# Altium footprint library ICs And Semiconductors SMD.PcbLib: 943 footprints (part 57 of 60)
Each footprint in its own frame and in the unit in brackets; x right, y up, seen from the top. Pads: shape width x height; smd on the part's side, far side on the other; paste and mask are expansions set on the pad; w line width, h text height; cw(c..) or ccw(c..) is an arc to the next point about the centre after c.
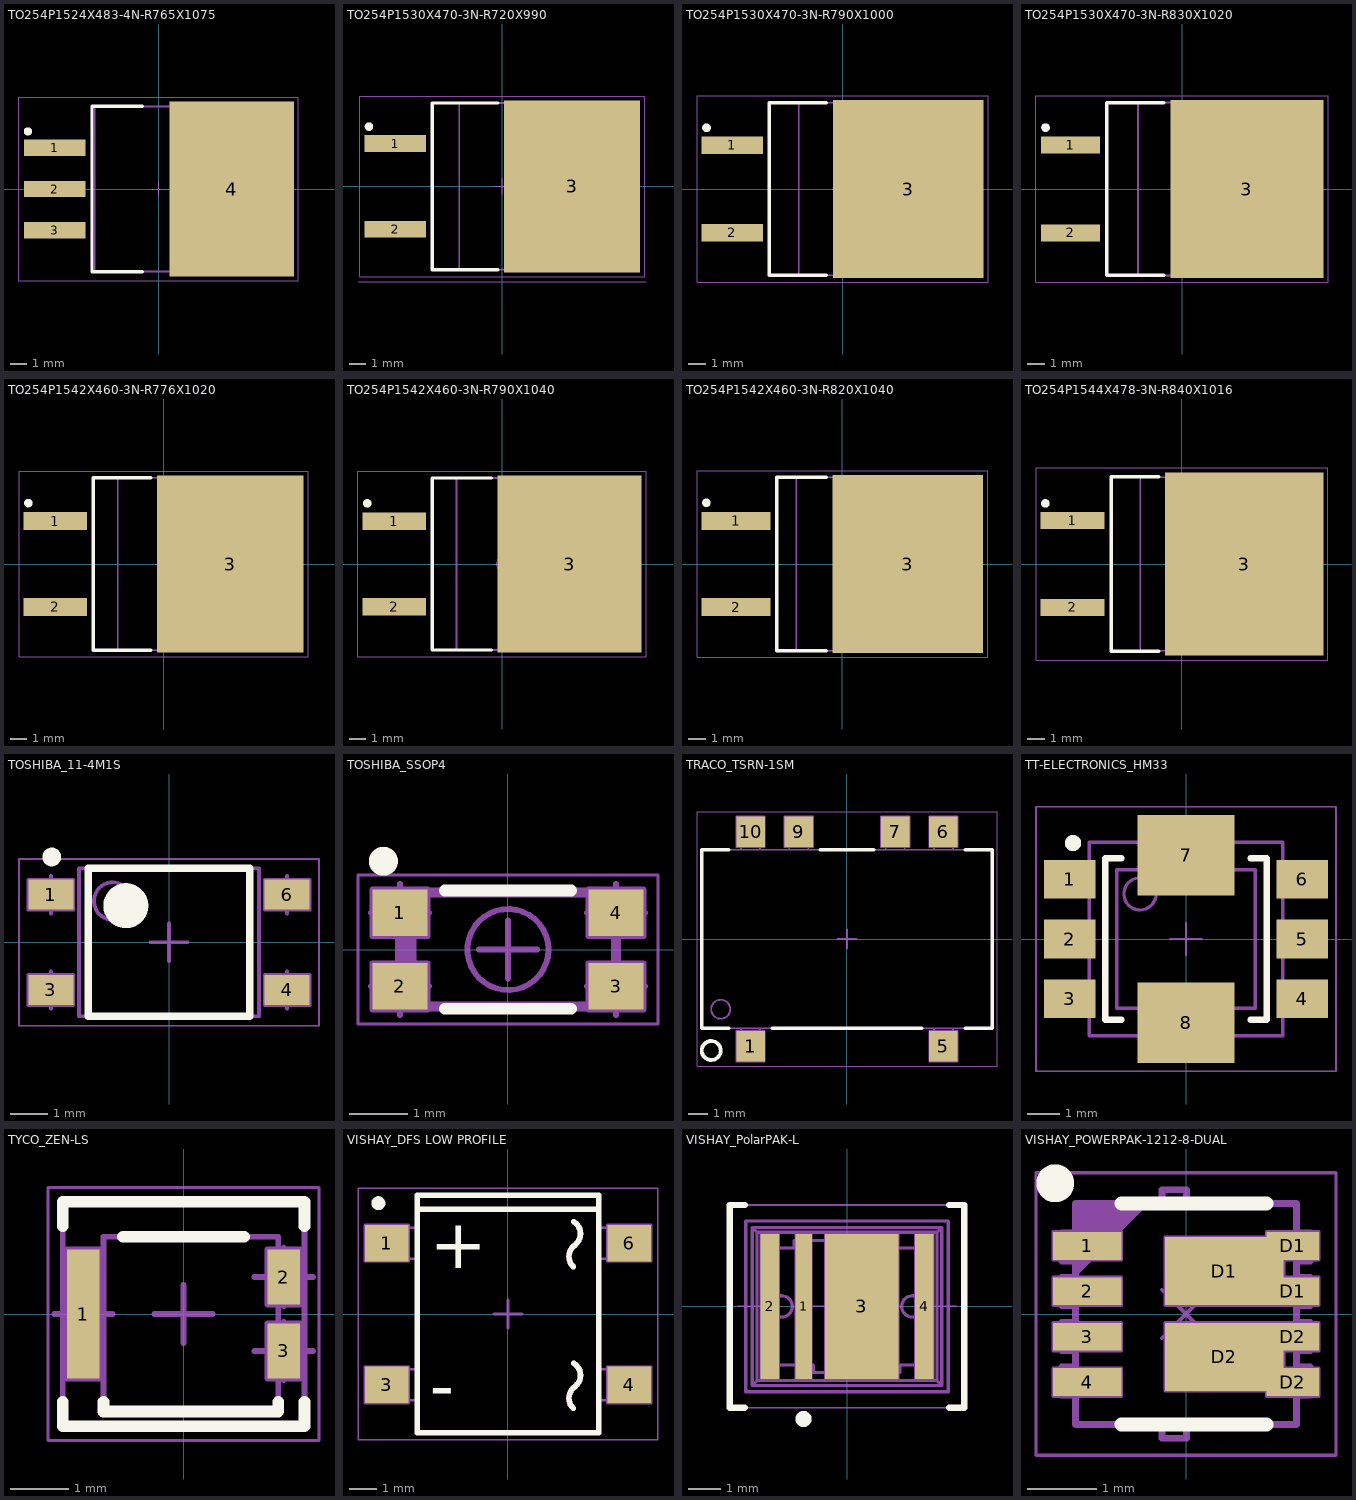
[diagram p56: the footprints below, top view; thin cyan lines are the x and y axes]

## TO254P1524X483-4N-R765X1075 [mm] "D2PAK TO-263, TO, 2.54mm pitch; 3 pin, 15.24mm L X 10.67mm W X 4.83mm H body, IPC Medium Density"
height 4.83
pads (4):
  rect 3.8x1 smd: 1(-6.4,2.54) 2(-6.4,0) 3(-6.4,-2.54)
  rect 7.65x10.75 smd: 4(4.5,0)
Top Overlay:
  circle w0.25: c-8.05,3.55 r0.125
  lines w0.2: -1,-5.1 -4.1,-5.1 -4.1,5.1 -1,5.1
Top Paste:
  region: 0.59,-4.8 1.93,-4.8 1.93,-3.36 0.59,-3.36
  region: 2.65,-4.8 3.99,-4.8 3.99,-3.36 2.65,-3.36
  region: 4.71,-4.8 6.05,-4.8 6.05,-3.36 4.71,-3.36
  region: 6.77,-4.8 8.11,-4.8 8.11,-3.36 6.77,-3.36
  region: 0.59,-2.76 1.93,-2.76 1.93,-1.32 0.59,-1.32
  region: 2.65,-2.76 3.99,-2.76 3.99,-1.32 2.65,-1.32
  region: 4.71,-2.76 6.05,-2.76 6.05,-1.32 4.71,-1.32
  region: 6.77,-2.76 8.11,-2.76 8.11,-1.32 6.77,-1.32
  region: 0.59,-0.72 1.93,-0.72 1.93,0.72 0.59,0.72
  region: 2.65,-0.72 3.99,-0.72 3.99,0.72 2.65,0.72
  region: 4.71,-0.72 6.05,-0.72 6.05,0.72 4.71,0.72
  region: 6.77,-0.72 8.11,-0.72 8.11,0.72 6.77,0.72
  region: 0.59,1.32 1.93,1.32 1.93,2.76 0.59,2.76
  region: 2.65,1.32 3.99,1.32 3.99,2.76 2.65,2.76
  region: 4.71,1.32 6.05,1.32 6.05,2.76 4.71,2.76
  region: 6.77,1.32 8.11,1.32 8.11,2.76 6.77,2.76
  region: 0.59,3.36 1.93,3.36 1.93,4.8 0.59,4.8
  region: 2.65,3.36 3.99,3.36 3.99,4.8 2.65,4.8
  region: 4.71,3.36 6.05,3.36 6.05,4.8 4.71,4.8
  region: 6.77,3.36 8.11,3.36 8.11,4.8 6.77,4.8
Mechanical 14:
  lines w0.1: 6.48,-5.08 6.856,-5.08 7.62,-4.234 7.62,4.234 6.856,5.08 6.48,5.08 ; 6.48,-5.08 6.48,5.08 ; 6.48,-5.08 -3.945,-5.08 -3.945,5.08 6.48,5.08
Mechanical 15:
  lines w0.05: -0.5,0 0.5,0 ; 0,-0.5 0,0.5 ; -8.6,-5.65 -8.6,5.65 8.6,5.65 8.6,-5.65 -8.6,-5.65
3D body "TO254P1524X483-4N-R765X1075.stp": height 4.83, standoff 0, extent -7.622,-5.08 7.623,5.08

## TO254P1530X470-3N-R720X990 [mm] "D2PAK TO-263A, TO,2.54mm pitch;2 pin,15.30mm L X 9.20mm W X 4.70mm H body, IPC Medium Density"
height 4.7
pads (3):
  rect 3.65x1 smd: 1(-6.35,2.54) 2(-6.35,-2.54)
  rect 8.05x10.2 smd: 3(4.15,0)
Top Overlay:
  circle w0.25: c-7.9,3.55 r0.125
  lines w0.2: -0.25,-4.95 -4.15,-4.95 -4.15,4.95 -0.25,4.95
Top Paste:
  region: 5.76,2.71 7.34,2.71 7.34,4.43 5.76,4.43
  region: 3.36,2.71 4.94,2.71 4.94,4.43 3.36,4.43
  region: 0.96,2.71 2.54,2.71 2.54,4.43 0.96,4.43
  region: 5.76,0.33 7.34,0.33 7.34,2.05 5.76,2.05
  region: 3.36,0.33 4.94,0.33 4.94,2.05 3.36,2.05
  region: 0.96,0.33 2.54,0.33 2.54,2.05 0.96,2.05
  region: 5.76,-2.05 7.34,-2.05 7.34,-0.33 5.76,-0.33
  region: 3.36,-2.05 4.94,-2.05 4.94,-0.33 3.36,-0.33
  region: 0.96,-2.05 2.54,-2.05 2.54,-0.33 0.96,-0.33
  region: 5.76,-4.43 7.34,-4.43 7.34,-2.71 5.76,-2.71
  region: 3.36,-4.43 4.94,-4.43 4.94,-2.71 3.36,-2.71
  region: 0.96,-4.43 2.54,-4.43 2.54,-2.71 0.96,-2.71
Mechanical 14:
  lines w0.1: 6.65,-4.95 -2.55,-4.95 -2.55,4.95 6.65,4.95 ; 6.65,-4.95 6.65,4.95 ; 6.65,-4.95 6.98,-4.95 7.65,-4.208 7.65,4.208 6.98,4.95 6.65,4.95
Mechanical 15:
  lines w0.05: -8.55,-5.65 8.55,-5.65 ; -0.5,0 0.5,0 ; 0,-0.5 0,0.5 ; -8.45,-5.35 8.45,-5.35 8.45,5.35 -8.45,5.35 -8.45,-5.35
3D body "TO254P1524X483-3N.stp": height 4.83, standoff 0, extent -7.622,-5.08 7.623,5.08

## TO254P1530X470-3N-R790X1000 [mm] "D2PAK TO-263, TO, 2.54mm pitch; 2 pin, 15.30mm L X 9.20mm W X 4.70mm H body, IPC Medium Density"
height 4.7
pads (3):
  rect 3.55x1 smd: 1(-6.4,2.54) 2(-6.4,-2.54)
  rect 8.75x10.3 smd: 3(3.8,0)
Top Overlay:
  circle w0.25: c-7.9,3.55 r0.125
  lines w0.2: -0.95,-5 -4.25,-5 -4.25,5 -0.95,5
Top Paste:
  region: 0.11,-4.45 1.43,-4.45 1.43,-2.75 0.11,-2.75
  region: 2.13,-4.45 3.45,-4.45 3.45,-2.75 2.13,-2.75
  region: 4.15,-4.45 5.47,-4.45 5.47,-2.75 4.15,-2.75
  region: 6.17,-4.45 7.49,-4.45 7.49,-2.75 6.17,-2.75
  region: 0.11,-2.05 1.43,-2.05 1.43,-0.35 0.11,-0.35
  region: 2.13,-2.05 3.45,-2.05 3.45,-0.35 2.13,-0.35
  region: 4.15,-2.05 5.47,-2.05 5.47,-0.35 4.15,-0.35
  region: 6.17,-2.05 7.49,-2.05 7.49,-0.35 6.17,-0.35
  region: 0.11,0.35 1.43,0.35 1.43,2.05 0.11,2.05
  region: 2.13,0.35 3.45,0.35 3.45,2.05 2.13,2.05
  region: 4.15,0.35 5.47,0.35 5.47,2.05 4.15,2.05
  region: 6.17,0.35 7.49,0.35 7.49,2.05 6.17,2.05
  region: 0.11,2.75 1.43,2.75 1.43,4.45 0.11,4.45
  region: 2.13,2.75 3.45,2.75 3.45,4.45 2.13,4.45
  region: 4.15,2.75 5.47,2.75 5.47,4.45 4.15,4.45
  region: 6.17,2.75 7.49,2.75 7.49,4.45 6.17,4.45
Mechanical 14:
  lines w0.1: 6.65,-5 6.98,-5 7.65,-4.258 7.65,4.258 6.98,5 6.65,5 ; 6.65,-5 6.65,5 ; 6.65,-5 -2.55,-5 -2.55,5 6.65,5
Mechanical 15:
  lines w0.05: -0.5,0 0.5,0 ; 0,-0.5 0,0.5 ; -8.45,-5.4 -8.45,5.4 8.45,5.4 8.45,-5.4 -8.45,-5.4
3D body "TO254P1524X483-3N.stp": height 4.83, standoff 0, extent -7.622,-5.08 7.623,5.08

## TO254P1530X470-3N-R830X1020 [mm] "D2PAK TO-263, TO, 2.54mm Pitch; 2 Pin, 15.30mm L X 9.20mm W X 4.70mm H Body, IPC Medium Density"
pads (3):
  rect 3.4x1 smd: 1(-6.45,2.54) 2(-6.45,-2.54)
  rect 8.85x10.3 smd: 3(3.75,0)
Top Overlay:
  circle w0.25: c-7.9,3.55 r0.125
  lines w0.2: -1.05,-5 -4.35,-5 -4.35,5 -1.05,5
Top Paste:
  region: 6.14,2.75 7.48,2.75 7.48,4.45 6.14,4.45
  region: 4.1,2.75 5.44,2.75 5.44,4.45 4.1,4.45
  region: 2.06,2.75 3.4,2.75 3.4,4.45 2.06,4.45
  region: 0.02,2.75 1.36,2.75 1.36,4.45 0.02,4.45
  region: 6.14,0.35 7.48,0.35 7.48,2.05 6.14,2.05
  region: 4.1,0.35 5.44,0.35 5.44,2.05 4.1,2.05
  region: 2.06,0.35 3.4,0.35 3.4,2.05 2.06,2.05
  region: 0.02,0.35 1.36,0.35 1.36,2.05 0.02,2.05
  region: 6.14,-2.05 7.48,-2.05 7.48,-0.35 6.14,-0.35
  region: 4.1,-2.05 5.44,-2.05 5.44,-0.35 4.1,-0.35
  region: 2.06,-2.05 3.4,-2.05 3.4,-0.35 2.06,-0.35
  region: 0.02,-2.05 1.36,-2.05 1.36,-0.35 0.02,-0.35
  region: 6.14,-4.45 7.48,-4.45 7.48,-2.75 6.14,-2.75
  region: 4.1,-4.45 5.44,-4.45 5.44,-2.75 4.1,-2.75
  region: 2.06,-4.45 3.4,-4.45 3.4,-2.75 2.06,-2.75
  region: 0.02,-4.45 1.36,-4.45 1.36,-2.75 0.02,-2.75
Mechanical 14:
  lines w0.1: 6.65,-5 6.98,-5 7.65,-4.258 7.65,4.258 6.98,5 6.65,5 ; 6.65,-5 6.65,5 ; 6.65,-5 -2.55,-5 -2.55,5 6.65,5
Mechanical 15:
  circle w0.05: c0,0 r0.35
  lines w0.05: -0.5,0 0.5,0 ; 0,-0.5 0,0.5 ; -8.45,-5.4 -8.45,5.4 8.45,5.4 8.45,-5.4 -8.45,-5.4
3D body "TO254P1530X470-3N-R830X1020.stp": height 4.7, standoff 0, extent -7.91,-5.097 7.71,5.103

## TO254P1542X460-3N-R776X1020 [mm] "D2PAK TO-263 TO, 2.54mm pitch; 2 pin, 15.425mm L X 9.15mm W X 4.60mm H body, IPC Medium Density"
height 4.6
pads (3):
  rect 3.75x1.05 smd: 1(-6.4,2.54) 2(-6.4,-2.54)
  rect 8.65x10.5 smd: 3(3.95,0)
Top Overlay:
  circle w0.25: c-8,3.6 r0.125
  lines w0.2: -0.75,-5.1 -4.15,-5.1 -4.15,5.1 -0.75,5.1
Top Paste:
  region: 6.3,3.26 7.6,3.26 7.6,4.66 6.3,4.66
  region: 4.3,3.26 5.6,3.26 5.6,4.66 4.3,4.66
  region: 2.3,3.26 3.6,3.26 3.6,4.66 2.3,4.66
  region: 0.3,3.26 1.6,3.26 1.6,4.66 0.3,4.66
  region: 6.3,1.28 7.6,1.28 7.6,2.68 6.3,2.68
  region: 4.3,1.28 5.6,1.28 5.6,2.68 4.3,2.68
  region: 2.3,1.28 3.6,1.28 3.6,2.68 2.3,2.68
  region: 0.3,1.28 1.6,1.28 1.6,2.68 0.3,2.68
  region: 6.3,-0.7 7.6,-0.7 7.6,0.7 6.3,0.7
  region: 4.3,-0.7 5.6,-0.7 5.6,0.7 4.3,0.7
  region: 2.3,-0.7 3.6,-0.7 3.6,0.7 2.3,0.7
  region: 0.3,-0.7 1.6,-0.7 1.6,0.7 0.3,0.7
  region: 6.3,-2.68 7.6,-2.68 7.6,-1.28 6.3,-1.28
  region: 4.3,-2.68 5.6,-2.68 5.6,-1.28 4.3,-1.28
  region: 2.3,-2.68 3.6,-2.68 3.6,-1.28 2.3,-1.28
  region: 0.3,-2.68 1.6,-2.68 1.6,-1.28 0.3,-1.28
  region: 6.3,-4.66 7.6,-4.66 7.6,-3.26 6.3,-3.26
  region: 4.3,-4.66 5.6,-4.66 5.6,-3.26 4.3,-3.26
  region: 2.3,-4.66 3.6,-4.66 3.6,-3.26 2.3,-3.26
  region: 0.3,-4.66 1.6,-4.66 1.6,-3.26 0.3,-3.26
Mechanical 14:
  lines w0.1: 6.442,-5.1 -2.708,-5.1 -2.708,5.1 6.442,5.1 ; 6.442,-5.1 6.442,5.1 ; 6.442,-5.1 6.861,-5.1 7.712,-4.157 7.712,4.157 6.861,5.1 6.442,5.1
Mechanical 15:
  lines w0.05: -0.5,0 0.5,0 ; 0,-0.5 0,0.5 ; -8.55,-5.5 8.55,-5.5 8.55,5.5 -8.55,5.5 -8.55,-5.5
3D body "TO254P1524X483-3N.stp": height 4.83, standoff 0, extent -7.622,-5.08 7.623,5.08

## TO254P1542X460-3N-R790X1040 [mm] "D2PAK TO-263, TO, 2.54mm pitch; 2 pin,15.425mm L X 9.15mm W X 4.60mm H body, IPC Medium Density"
height 4.6
pads (3):
  rect 3.75x1.05 smd: 1(-6.4,2.54) 2(-6.4,-2.54)
  rect 8.55x10.5 smd: 3(4,0)
Top Overlay:
  circle w0.25: c-8,3.6 r0.125
  lines w0.2: -0.65,-5.1 -4.15,-5.1 -4.15,5.1 -0.65,5.1
Top Paste:
  region: 0.39,-4.66 1.67,-4.66 1.67,-3.26 0.39,-3.26
  region: 2.37,-4.66 3.65,-4.66 3.65,-3.26 2.37,-3.26
  region: 4.35,-4.66 5.63,-4.66 5.63,-3.26 4.35,-3.26
  region: 6.33,-4.66 7.61,-4.66 7.61,-3.26 6.33,-3.26
  region: 0.39,-2.68 1.67,-2.68 1.67,-1.28 0.39,-1.28
  region: 2.37,-2.68 3.65,-2.68 3.65,-1.28 2.37,-1.28
  region: 4.35,-2.68 5.63,-2.68 5.63,-1.28 4.35,-1.28
  region: 6.33,-2.68 7.61,-2.68 7.61,-1.28 6.33,-1.28
  region: 0.39,-0.7 1.67,-0.7 1.67,0.7 0.39,0.7
  region: 2.37,-0.7 3.65,-0.7 3.65,0.7 2.37,0.7
  region: 4.35,-0.7 5.63,-0.7 5.63,0.7 4.35,0.7
  region: 6.33,-0.7 7.61,-0.7 7.61,0.7 6.33,0.7
  region: 0.39,1.28 1.67,1.28 1.67,2.68 0.39,2.68
  region: 2.37,1.28 3.65,1.28 3.65,2.68 2.37,2.68
  region: 4.35,1.28 5.63,1.28 5.63,2.68 4.35,2.68
  region: 6.33,1.28 7.61,1.28 7.61,2.68 6.33,2.68
  region: 0.39,3.26 1.67,3.26 1.67,4.66 0.39,4.66
  region: 2.37,3.26 3.65,3.26 3.65,4.66 2.37,4.66
  region: 4.35,3.26 5.63,3.26 5.63,4.66 4.35,4.66
  region: 6.33,3.26 7.61,3.26 7.61,4.66 6.33,4.66
Mechanical 14:
  lines w0.1: 6.442,-5.1 -2.708,-5.1 -2.708,5.1 6.442,5.1 ; 6.442,-5.1 6.442,5.1 ; 6.442,-5.1 6.861,-5.1 7.712,-4.157 7.712,4.157 6.861,5.1 6.442,5.1
Mechanical 15:
  circle w0.05: c0,0 r0.35
  lines w0.05: -0.5,0 0.5,0 ; 0,-0.5 0,0.5 ; -8.55,-5.5 8.55,-5.5 8.55,5.5 -8.55,5.5 -8.55,-5.5
3D body "TO254P1542X460-3N-R790X1040.stp": height 4.6, standoff 0, extent -7.622,-5.08 7.623,5.08

## TO254P1542X460-3N-R820X1040 [mm] "D2PAK TO-263, TO, 2.54mm pitch; 2 pin,15.425mm L X 9.15mm W X 4.60mm H body, IPC Medium Density"
height 4.6
pads (3):
  rect 4.05x1.05 smd: 1(-6.25,2.54) 2(-6.25,-2.54)
  rect 8.85x10.5 smd: 3(3.85,0)
Top Overlay:
  circle w0.25: c-8,3.6 r0.125
  lines w0.2: -0.95,-5.1 -3.85,-5.1 -3.85,5.1 -0.95,5.1
Top Paste:
  region: 6.24,3.26 7.58,3.26 7.58,4.66 6.24,4.66
  region: 4.2,3.26 5.54,3.26 5.54,4.66 4.2,4.66
  region: 2.16,3.26 3.5,3.26 3.5,4.66 2.16,4.66
  region: 0.12,3.26 1.46,3.26 1.46,4.66 0.12,4.66
  region: 6.24,1.28 7.58,1.28 7.58,2.68 6.24,2.68
  region: 4.2,1.28 5.54,1.28 5.54,2.68 4.2,2.68
  region: 2.16,1.28 3.5,1.28 3.5,2.68 2.16,2.68
  region: 0.12,1.28 1.46,1.28 1.46,2.68 0.12,2.68
  region: 6.24,-0.7 7.58,-0.7 7.58,0.7 6.24,0.7
  region: 4.2,-0.7 5.54,-0.7 5.54,0.7 4.2,0.7
  region: 2.16,-0.7 3.5,-0.7 3.5,0.7 2.16,0.7
  region: 0.12,-0.7 1.46,-0.7 1.46,0.7 0.12,0.7
  region: 6.24,-2.68 7.58,-2.68 7.58,-1.28 6.24,-1.28
  region: 4.2,-2.68 5.54,-2.68 5.54,-1.28 4.2,-1.28
  region: 2.16,-2.68 3.5,-2.68 3.5,-1.28 2.16,-1.28
  region: 0.12,-2.68 1.46,-2.68 1.46,-1.28 0.12,-1.28
  region: 6.24,-4.66 7.58,-4.66 7.58,-3.26 6.24,-3.26
  region: 4.2,-4.66 5.54,-4.66 5.54,-3.26 4.2,-3.26
  region: 2.16,-4.66 3.5,-4.66 3.5,-3.26 2.16,-3.26
  region: 0.12,-4.66 1.46,-4.66 1.46,-3.26 0.12,-3.26
Mechanical 14:
  lines w0.1: 6.442,-5.1 6.861,-5.1 7.712,-4.157 7.712,4.157 6.861,5.1 6.442,5.1 ; 6.442,-5.1 6.442,5.1 ; 6.442,-5.1 -2.708,-5.1 -2.708,5.1 6.442,5.1
Mechanical 15:
  circle w0.05: c0,0 r0.35
  lines w0.05: -0.5,0 0.5,0 ; 0,-0.5 0,0.5 ; -8.55,-5.5 -8.55,5.5 8.55,5.5 8.55,-5.5 -8.55,-5.5
3D body "TO254P1542X460-3N-R820X1040.stp": height 4.6, standoff 0, extent -7.71,-5.08 7.71,5.083

## TO254P1544X478-3N-R840X1016 [mm] "D2PAK TO-263A,TO, 2.54mm pitch; 2 pin,1 5.435mm L X 9.27mm W X 4.78mm H body, IPC Medium Density"
height 4.78
pads (3):
  rect 3.75x1 smd: 1(-6.4,2.54) 2(-6.4,-2.54)
  rect 9.3x10.75 smd: 3(3.65,0)
Top Overlay:
  circle w0.25: c-8,3.55 r0.125
  lines w0.2: -1.35,-5.1 -4.15,-5.1 -4.15,5.1 -1.35,5.1
Top Paste:
  region: -0.3,-4.75 -0.3,-3.33 1.12,-3.33 1.12,-4.75
  region: 1.86,-4.75 1.86,-3.33 3.28,-3.33 3.28,-4.75
  region: 4.02,-4.75 4.02,-3.33 5.44,-3.33 5.44,-4.75
  region: 6.18,-4.75 6.18,-3.33 7.6,-3.33 7.6,-4.75
  region: -0.3,-2.73 -0.3,-1.31 1.12,-1.31 1.12,-2.73
  region: 1.86,-2.73 1.86,-1.31 3.28,-1.31 3.28,-2.73
  region: 4.02,-2.73 4.02,-1.31 5.44,-1.31 5.44,-2.73
  region: 6.18,-2.73 6.18,-1.31 7.6,-1.31 7.6,-2.73
  region: -0.3,-0.71 -0.3,0.71 1.12,0.71 1.12,-0.71
  region: 1.86,-0.71 1.86,0.71 3.28,0.71 3.28,-0.71
  region: 4.02,-0.71 4.02,0.71 5.44,0.71 5.44,-0.71
  region: 6.18,-0.71 6.18,0.71 7.6,0.71 7.6,-0.71
  region: -0.3,1.31 -0.3,2.73 1.12,2.73 1.12,1.31
  region: 1.86,1.31 1.86,2.73 3.28,2.73 3.28,1.31
  region: 4.02,1.31 4.02,2.73 5.44,2.73 5.44,1.31
  region: 6.18,1.31 6.18,2.73 7.6,2.73 7.6,1.31
  region: -0.3,3.33 -0.3,4.75 1.12,4.75 1.12,3.33
  region: 1.86,3.33 1.86,4.75 3.28,4.75 3.28,3.33
  region: 4.02,3.33 4.02,4.75 5.44,4.75 5.44,3.33
  region: 6.18,3.33 6.18,4.75 7.6,4.75 7.6,3.33
Mechanical 14:
  lines w0.1: 6.828,-5.08 7.121,-5.08 7.717,-4.419 7.717,4.419 7.121,5.08 6.828,5.08 ; 6.828,-5.08 6.828,5.08 ; 6.828,-5.08 -2.442,-5.08 -2.442,5.08 6.828,5.08
Mechanical 15:
  lines w0.05: -0.5,0 0.5,0 ; 0,-0.5 0,0.5 ; -8.55,-5.65 -8.55,5.65 8.55,5.65 8.55,-5.65 -8.55,-5.65
3D body "TO254P1524X483-3N.stp": height 4.83, standoff 0, extent -7.622,-5.08 7.623,5.08

## TOSHIBA_11-4M1S [mm] "SOIC,1.27mm Pitch; 4 pin, TOSHIBA Case (5mm Creepage)"
height 2.3
pads (4):
  rect 1.2x0.8 smd: 1(-3.15,1.27) 3(-3.15,-1.27) 4(3.15,-1.27) 6(3.15,1.27)
Top Overlay:
  circle w0.25: c-3.125,2.275 r0.125
  circle w0.6: c-1.15,0.975 r0.3
  lines w0.2: -2.15,-1.975 -2.15,1.975 2.15,1.975 2.15,-1.975 -2.15,-1.975
Mechanical 8:
  lines w0.1: -3.65,-1.27 -3.15,-1.27 ; -3.65,1.27 -3.15,1.27 ; -3.15,-1.77 -3.15,-1.27 ; -3.15,-0.77 -3.15,-1.27 ; -3.15,0.77 -3.15,1.27 ; -3.15,1.77 -3.15,1.27 ; -2.65,-1.27 -3.15,-1.27 ; -2.65,1.27 -3.15,1.27 ; -0.5,0 0,0 ; 0,-0.5 0,0 ; 0,0.5 0,0 ; 0.5,0 0,0 ; 2.65,-1.27 3.15,-1.27 ; 2.65,1.27 3.15,1.27 ; 3.15,-1.77 3.15,-1.27 ; 3.15,-0.77 3.15,-1.27 ; 3.15,0.77 3.15,1.27 ; 3.15,1.77 3.15,1.27 ; 3.65,-1.27 3.15,-1.27 ; 3.65,1.27 3.15,1.27 ; -3.75,-1.67 -2.55,-1.67 -2.55,-0.87 -3.75,-0.87 -3.75,-1.67 ; -3.75,0.87 -2.55,0.87 -2.55,1.67 -3.75,1.67 -3.75,0.87 ; 2.55,-1.67 3.75,-1.67 3.75,-0.87 2.55,-0.87 2.55,-1.67 ; 2.55,0.87 3.75,0.87 3.75,1.67 2.55,1.67 2.55,0.87
Mechanical 14:
  circle w0.1: c-1.5,1.1 r0.5
  lines w0.1: -2.4,-1.975 2.4,-1.975 2.4,1.975 -2.4,1.975 -2.4,-1.975
Mechanical 15:
  lines w0.05: -4,-2.225 4,-2.225 4,2.225 -4,2.225 -4,-2.225
3D body "TOSHIBA_11-4M1S.stp": height 2.3, standoff 0, extent -3.7,-1.975 3.7,1.975

## TOSHIBA_SSOP4 [mm] "TOSHIBA SSOP4, 1.27mm Pitch; 4 Pin, 2.04mm L X 3.8mm W X 1.8mm H Body"
height 1.8
pads (4):
  rect 0.95x0.8 smd: 1(-1.865,0.635) 2(-1.865,-0.635) 3(1.865,-0.635) 4(1.865,0.635)
Top Overlay:
  circle w0.25: c-2.15,1.525 r0.125
  lines w0.2: -1.09,-1.02 1.09,-1.02 ; -1.09,1.02 1.09,1.02
Mechanical 8:
  lines w0.1: -2.365,-0.635 -1.865,-0.635 ; -2.365,0.635 -1.865,0.635 ; -2.1,0.785 -2.1,1.035 ; -1.865,-1.135 -1.865,-0.635 ; -1.865,-0.135 -1.865,-0.635 ; -1.865,0.135 -1.865,0.635 ; -1.865,1.135 -1.865,0.635 ; -1.365,-0.635 -1.865,-0.635 ; -1.365,0.635 -1.865,0.635 ; -0.5,0 0,0 ; 0,-0.5 0,0 ; 0,0.5 0,0 ; 0.5,0 0,0 ; 1.365,-0.635 1.865,-0.635 ; 1.365,0.635 1.865,0.635 ; 1.865,-1.135 1.865,-0.635 ; 1.865,-0.135 1.865,-0.635 ; 1.865,0.135 1.865,0.635 ; 1.865,1.135 1.865,0.635 ; 2.365,-0.635 1.865,-0.635 ; 2.365,0.635 1.865,0.635 ; -2.34,-1.035 -1.39,-1.035 -1.39,-0.235 -2.34,-0.235 -2.34,-1.035 ; -2.34,0.235 -1.39,0.235 -1.39,1.035 -2.34,1.035 -2.34,0.235 ; 1.39,-1.035 2.34,-1.035 2.34,-0.235 1.39,-0.235 1.39,-1.035 ; 1.39,0.235 2.34,0.235 2.34,1.035 1.39,1.035 1.39,0.235
Mechanical 14:
  circle w0.1: c0,0 r0.7
  lines w0.1: -1.9,-0.785 -2.1,-0.785 -2.1,-0.485 -1.9,-0.485 ; -1.9,0.485 -2.1,0.485 -2.1,0.785 -1.9,0.785 ; -1.78,-0.95 -1.78,0.95 ; -1.73,-0.95 -1.73,0.95 ; -1.68,-0.95 -1.68,0.95 ; 1.9,-0.785 2.1,-0.785 2.1,-0.485 1.9,-0.485 ; 1.9,0.485 2.1,0.485 2.1,0.785 1.9,0.785 ; -1.9,-1.02 1.9,-1.02 ; -1.9,-1.02 -1.9,1.02 ; -1.9,-1.02 -1.838,-0.958 ; -1.9,1.02 1.9,1.02 ; -1.9,1.02 -1.838,0.958 ; -1.838,-0.958 -1.63,-0.95 ; -1.838,-0.958 -1.838,0.958 ; -1.838,0.958 -1.63,0.95 ; -1.63,-0.95 1.83,-0.95 ; -1.63,-0.95 -1.63,0.95 ; -1.63,0.95 1.83,0.95 ; 1.83,-0.95 1.83,0.95 ; 1.83,-0.95 1.9,-1.02 ; 1.83,0.95 1.9,1.02 ; 1.9,-1.02 1.9,1.02
Mechanical 15:
  lines w0.05: -2.59,-1.285 -2.59,1.285 2.59,1.285 2.59,-1.285 -2.59,-1.285
3D body "TOSHIBA_SSOP4.stp": height 1.8, standoff 0, extent -2.1,-1.02 2.1,1.02

## TRACO_TSRN-1SM [mm] "TSRN-1SM Case, 6-Pin, Pitch 2.13mm, Body 15.2x9.3mm"
height 7.4
pads (6):
  rect 1.5x1.61 smd: 1(-5.08,-5.655) 5(5.08,-5.655) 6(5.08,5.655) 7(2.54,5.655) 9(-2.54,5.655) 10(-5.08,5.655)
Top Overlay:
  circle w0.2: c-7.15,-5.875 r0.5
  lines w0.2: -6.225,-4.7 -7.65,-4.7 -7.65,4.7 -6.225,4.7 ; -3.935,-4.7 3.935,-4.7 ; -1.395,4.7 1.395,4.7 ; 6.225,-4.7 7.65,-4.7 7.65,4.7 6.225,4.7
Mechanical 8:
  lines w0.1: -5.58,-5.655 -5.08,-5.655 ; -5.58,5.655 -5.08,5.655 ; -5.08,-6.155 -5.08,-5.655 ; -5.08,-5.155 -5.08,-5.655 ; -5.08,5.155 -5.08,5.655 ; -5.08,6.155 -5.08,5.655 ; -4.58,-5.655 -5.08,-5.655 ; -4.58,5.655 -5.08,5.655 ; -3.04,5.655 -2.54,5.655 ; -2.54,5.155 -2.54,5.655 ; -2.54,6.155 -2.54,5.655 ; -2.04,5.655 -2.54,5.655 ; -0.5,0 0,0 ; 0,-0.5 0,0 ; 0,0.5 0,0 ; 0.5,0 0,0 ; 2.04,5.655 2.54,5.655 ; 2.54,5.155 2.54,5.655 ; 2.54,6.155 2.54,5.655 ; 3.04,5.655 2.54,5.655 ; 4.58,-5.655 5.08,-5.655 ; 4.58,5.655 5.08,5.655 ; 5.08,-6.155 5.08,-5.655 ; 5.08,-5.155 5.08,-5.655 ; 5.08,5.155 5.08,5.655 ; 5.08,6.155 5.08,5.655 ; 5.58,-5.655 5.08,-5.655 ; 5.58,5.655 5.08,5.655 ; -5.83,-6.46 -4.33,-6.46 -4.33,-4.85 -5.83,-4.85 -5.83,-6.46 ; -5.83,4.85 -4.33,4.85 -4.33,6.46 -5.83,6.46 -5.83,4.85 ; -3.29,4.85 -1.79,4.85 -1.79,6.46 -3.29,6.46 -3.29,4.85 ; 1.79,4.85 3.29,4.85 3.29,6.46 1.79,6.46 1.79,4.85 ; 4.33,-6.46 5.83,-6.46 5.83,-4.85 4.33,-4.85 4.33,-6.46 ; 4.33,4.85 5.83,4.85 5.83,6.46 4.33,6.46 4.33,4.85
Mechanical 14:
  circle w0.1: c-6.65,-3.7 r0.5
  lines w0.1: -5.58,-4.7 -5.58,-5.453 -5.33,-5.453 -5.33,-6.063 -4.83,-6.063 -4.83,-5.453 -4.58,-5.453 -4.58,-4.7 ; -5.58,4.7 -5.58,5.453 -5.33,5.453 -5.33,6.063 -4.83,6.063 -4.83,5.453 -4.58,5.453 -4.58,4.7 ; -3.04,4.7 -3.04,5.453 -2.79,5.453 -2.79,6.063 -2.29,6.063 -2.29,5.453 -2.04,5.453 -2.04,4.7 ; 2.04,4.7 2.04,5.453 2.29,5.453 2.29,6.063 2.79,6.063 2.79,5.453 3.04,5.453 3.04,4.7 ; 4.58,-4.7 4.58,-5.453 4.83,-5.453 4.83,-6.063 5.33,-6.063 5.33,-5.453 5.58,-5.453 5.58,-4.7 ; 4.58,4.7 4.58,5.453 4.83,5.453 4.83,6.063 5.33,6.063 5.33,5.453 5.58,5.453 5.58,4.7 ; -7.65,-4.7 -7.65,4.7 7.65,4.7 7.65,-4.7 -7.65,-4.7
Mechanical 15:
  lines w0.05: -7.9,-6.71 -7.9,6.71 7.9,6.71 7.9,-6.71 -7.9,-6.71
3D body "TRACO_TSRN-1SM.stp": height 7.4, standoff 0, extent -7.65,-6.062 7.65,6.063

## TT-ELECTRONICS_HM33 [mm] "TT ELECTRONICS HM33 Serie, Current Sense SMD Transformers, 8-Leads, Pitch 1.85mm"
height 5.33
pads (8):
  rect 1.6x1.2 smd: 1(-3.6,1.85) 2(-3.6,0) 3(-3.6,-1.85) 4(3.6,-1.85) 5(3.6,0) 6(3.6,1.85)
  rect 3x2.5 smd: 7(0,2.6) 8(0,-2.6)
Top Overlay:
  circle w0.25: c-3.5,2.975 r0.125
  lines w0.2: -2,-2.5 -2.5,-2.5 -2.5,2.5 -2,2.5 ; 2,-2.5 2.5,-2.5 2.5,2.5 2,2.5
Mechanical 14:
  circle w0.1: c-1.425,1.4 r0.5
  lines w0.1: -3,-3 -3,3 3,3 3,-3 -3,-3 ; -2.15,-2.15 2.15,-2.15 2.15,2.15 -2.15,2.15 -2.15,-2.15
Mechanical 15:
  lines w0.05: -0.5,0 0.5,0 ; 0,-0.5 0,0.5 ; -4.65,-4.1 4.65,-4.1 4.65,4.1 -4.65,4.1 -4.65,-4.1
3D body: height 5.33, standoff 0, extent -2.149,-2.149 2.149,2.149
3D body: height 2.6, standoff 0, extent -2.999,-2.999 2.999,2.999

## TYCO_ZEN-LS [mm] "PolyZen, Polymer Enhanced Zener Diode. Case LS, 3-Pin, Body 4x4mm"
height 2
pads (3):
  rect 0.56x2.21 smd: 1(-1.72,0)
  rect 0.56x0.94 smd: 2(1.72,0.635) 3(1.72,-0.635)
Top Overlay:
  lines w0.2: -2.075,-1.505 -2.075,-1.925 2.075,-1.925 2.075,-1.505 ; -2.075,1.505 -2.075,1.925 2.075,1.925 2.075,1.505 ; -1.375,-1.505 -1.375,-1.675 1.625,-1.675 1.625,-1.505 ; -1.04,1.325 1.04,1.325
Mechanical 8:
  lines w0.1: -2.22,0 -1.72,0 ; -1.72,-0.5 -1.72,0 ; -1.72,0.5 -1.72,0 ; -1.22,0 -1.72,0 ; -0.5,0 0,0 ; 0,-0.5 0,0 ; 0,0.5 0,0 ; 0.5,0 0,0 ; 1.22,-0.635 1.72,-0.635 ; 1.22,0.635 1.72,0.635 ; 1.72,-1.135 1.72,-0.635 ; 1.72,-0.135 1.72,-0.635 ; 1.72,0.135 1.72,0.635 ; 1.72,1.135 1.72,0.635 ; 2.22,-0.635 1.72,-0.635 ; 2.22,0.635 1.72,0.635 ; -2,-1.105 -1.44,-1.105 -1.44,1.105 -2,1.105 -2,-1.105 ; 1.44,-1.105 1.44,-0.165 2,-0.165 2,-1.105 1.44,-1.105 ; 1.44,0.165 1.44,1.105 2,1.105 2,0.165 1.44,0.165
Mechanical 14:
  lines w0.1: -2.075,-1.925 -2.075,1.925 2.075,1.925 2.075,-1.925 -2.075,-1.925 ; -1.375,-1.675 -1.375,1.325 1.625,1.325 1.625,-1.675 -1.375,-1.675
Mechanical 15:
  lines w0.05: -2.325,-2.175 -2.325,2.175 2.325,2.175 2.325,-2.175 -2.325,-2.175
3D body "TYCO_ZEN-LS.stp": height 2, standoff 0, extent -2.075,-1.925 2.075,1.925

## VISHAY_DFS LOW PROFILE [mm] "VISHAY Low Profile DFS Case Style"
height 2.6
pads (4):
  rect 1.56x1.3 smd: 1(-4.35,2.54) 3(-4.35,-2.54) 4(4.35,-2.54) 6(4.35,2.54)
Top Overlay:
  circle w0.25: c-4.65,3.975 r0.125
  lines w0.2: -3.25,3.758 3.25,3.758 ; 2.337,-3.38 cw(c2.684,-3.02) 2.405,-2.605 ; 2.337,1.7 cw(c2.684,2.06) 2.405,2.475 ; 2.359,-1.77 cw(c2.102,-2.199) 2.425,-2.58 ; 2.359,3.31 cw(c2.102,2.881) 2.425,2.5 ; -3.25,-4.255 -3.25,4.255 3.25,4.255 3.25,-4.255 -3.25,-4.255
  text "-" at -2.8,-3.435 h1.8
  text "+" at -2.8,1.645 h1.8
Mechanical 8:
  lines w0.1: -4.85,-2.54 -4.35,-2.54 ; -4.85,2.54 -4.35,2.54 ; -4.35,-3.04 -4.35,-2.54 ; -4.35,-2.04 -4.35,-2.54 ; -4.35,2.04 -4.35,2.54 ; -4.35,3.04 -4.35,2.54 ; -3.85,-2.54 -4.35,-2.54 ; -3.85,2.54 -4.35,2.54 ; -0.5,0 0,0 ; 0,-0.5 0,0 ; 0,0.5 0,0 ; 0.5,0 0,0 ; 3.85,-2.54 4.35,-2.54 ; 3.85,2.54 4.35,2.54 ; 4.35,-3.04 4.35,-2.54 ; 4.35,-2.04 4.35,-2.54 ; 4.35,2.04 4.35,2.54 ; 4.35,3.04 4.35,2.54 ; 4.85,-2.54 4.35,-2.54 ; 4.85,2.54 4.35,2.54 ; -5.13,-3.19 -3.57,-3.19 -3.57,-1.89 -5.13,-1.89 -5.13,-3.19 ; -5.13,1.89 -3.57,1.89 -3.57,3.19 -5.13,3.19 -5.13,1.89 ; 3.57,-3.19 5.13,-3.19 5.13,-1.89 3.57,-1.89 3.57,-3.19 ; 3.57,1.89 5.13,1.89 5.13,3.19 3.57,3.19 3.57,1.89
Mechanical 14:
  lines w0.1: -3.25,-3.095 -5.025,-3.095 -5.025,-1.985 -3.25,-1.985 ; -3.25,1.985 -5.025,1.985 -5.025,3.095 -3.25,3.095 ; -3.25,3.758 3.25,3.758 ; 3.25,-3.095 5.025,-3.095 5.025,-1.985 3.25,-1.985 ; 3.25,1.985 5.025,1.985 5.025,3.095 3.25,3.095 ; -3.25,-4.255 -3.25,4.255 3.25,4.255 3.25,-4.255 -3.25,-4.255
  lines w0.2: 2.337,-3.38 cw(c2.684,-3.02) 2.405,-2.605 ; 2.337,1.7 cw(c2.684,2.06) 2.405,2.475 ; 2.359,-1.77 cw(c2.102,-2.199) 2.425,-2.58 ; 2.359,3.31 cw(c2.102,2.881) 2.425,2.5
  text "-" at -2.8,-3.435 h1.8
  text "+" at -2.8,1.645 h1.8
Mechanical 15:
  lines w0.05: -5.38,-4.505 5.38,-4.505 5.38,4.505 -5.38,4.505 -5.38,-4.505
3D body "VISHAY_DFS LOW PROFILE.stp": height 2.28, standoff 0, extent -5.025,-4.255 5.025,4.255

## VISHAY_PolarPAK-L [mm] "VISHAY PolarPAK Case Option L, 10-Leads - Body 6.3x5.31mm"
height 0.85
pads (4):
  rect 0.51x4.52 smd: 1(-1.35,0)
  rect 0.58x4.52 smd: 2(-2.405,0) 4(2.405,0)
  rect 2.29x4.52 smd: 3(0.46,0)
Top Overlay:
  circle w0.25: c-1.35,-3.5 r0.125
  lines w0.2: -3.175,-3.155 -3.65,-3.155 -3.65,3.155 -3.175,3.155 ; 3.175,-3.155 3.65,-3.155 3.65,3.155 3.175,3.155
Mechanical 8:
  lines w0.05: -3.405,0 -2.405,0 -2.405,-1 ; -1.35,-1 -1.35,0 -0.35,0 ; 0.46,-1 0.46,0 1.46,0 ; 2.405,-1 2.405,0 3.405,0 ; -2.695,-2.26 -2.115,-2.26 -2.115,2.26 -2.695,2.26 -2.695,-2.26 ; -1.605,-2.26 -1.095,-2.26 -1.095,2.26 -1.605,2.26 -1.605,-2.26 ; -0.685,-2.26 1.605,-2.26 1.605,2.26 -0.685,2.26 -0.685,-2.26 ; 2.115,-2.26 2.695,-2.26 2.695,2.26 2.115,2.26 2.115,-2.26
  text "D" at -2.667,2.455 h0.76
  text "G" at -1.651,2.455 h0.76
  text "S" at -0.508,2.455 h0.76
  text "S" at 0.762,2.455 h0.76
  text "D" at 2.159,2.455 h0.76
  text "D" at 2.159,-3.155 h0.76
  text "S" at 0.762,-3.155 h0.76
  text "S" at -0.508,-3.155 h0.76
  text "G" at -1.651,-3.155 h0.76
  text "D" at -2.667,-3.155 h0.76
Mechanical 14:
  lines w0.1: -2.95,-2.455 -2.95,2.455 ; -2.95,-2.455 2.95,-2.455 ; -2.95,-2.455 -2.8,-2.305 ; -2.95,2.455 2.95,2.455 ; -2.95,2.455 -2.8,2.305 ; -2.8,-2.305 -2.8,2.305 ; -2.8,-2.305 2.8,-2.305 ; -2.8,2.305 2.8,2.305 ; 2.8,-2.305 2.8,2.305 ; 2.8,-2.305 2.95,-2.455 ; 2.8,2.305 2.95,2.455 ; 2.95,-2.455 2.95,2.455 ; -3.15,-2.655 3.15,-2.655 3.15,2.655 -3.15,2.655 -3.15,-2.655 ; -2.25,-1.82 -2.25,-0.33 -2.03,-0.33 ccw(c-2.03,0) -2.03,0.33 -2.25,0.33 -2.25,1.82 -1.65,1.82 -1.65,2.05 1.05,2.05 1.05,1.82 2.25,1.82 2.25,0.33 2.03,0.33 ccw(c2.03,0) 2.03,-0.33 2.25,-0.33 2.25,-1.82 1.65,-1.82 1.65,-2.05 -1.05,-2.05 -1.05,-1.82 -2.25,-1.82
Mechanical 15:
  lines w0.05: -3.65,-3.155 3.65,-3.155 3.65,3.155 -3.65,3.155 -3.65,-3.155
3D body "SiE810DF-T1-E3.stp": height 0.85, standoff 0, extent -3.15,-2.655 3.15,2.655

## VISHAY_POWERPAK-1212-8-DUAL [mm] "SOIC, 1.27mm Pitch, 8 Pin, Body 3.21mm W X 3.21mm L X 1.12mm H, PowerPAK® 1212-8, (DUAL)"
height 1.12
pads (10):
  rect 0.99x0.405 smd: 1(-1.435,0.99) 2(-1.435,0.33) 3(-1.435,-0.33) 4(-1.435,-0.99)
  rect 1.725x0.99 smd: D1(0.557,0.623) D2(0.557,-0.623)
  rect 0.76x0.405 smd: D1(1.55,0.33) D1(1.55,0.99) D2(1.55,-0.99) D2(1.55,-0.33)
Top Overlay:
  circle w0.3: c-1.9,1.9 r0.125
  lines w0.2: -0.94,-1.605 1.17,-1.605 ; -0.94,1.605 1.17,1.605
Mechanical 8:
  lines w0.05: -0.354,-0.354 0,0 ; -0.354,0.354 0,0 ; 0.354,-0.354 0,0 ; 0.354,0.354 0,0 ; 1.17,-1.118 -0.305,-1.118 ; 1.17,1.118 -0.305,1.118 ; 1.42,-0.787 1.42,-0.533 ; 1.42,0.533 1.42,0.787 ; -1.93,-1.192 -1.435,-0.99 -1.93,-0.787 ; -1.93,-1.192 -1.93,-0.787 ; -1.93,-1.192 -0.94,-1.192 -0.94,-0.787 -1.93,-0.787 ; -1.93,-0.533 -1.435,-0.33 -1.93,-0.128 ; -1.93,-0.533 -1.93,-0.128 ; -1.93,-0.533 -0.94,-0.533 -0.94,-0.128 -1.93,-0.128 ; -1.93,0.128 -1.435,0.33 -1.93,0.533 ; -1.93,0.128 -1.93,0.533 ; -1.93,0.128 -0.94,0.128 -0.94,0.533 -1.93,0.533 ; -1.93,0.787 -1.435,0.99 -1.93,1.192 ; -1.93,0.787 -1.93,1.192 ; -1.93,0.787 -0.94,0.787 -0.94,1.192 -1.93,1.192 ; -0.305,-1.118 0.557,-0.623 -0.305,-0.128 ; -0.305,-1.118 -0.305,-0.128 ; -0.305,-0.128 1.17,-0.128 ; -0.305,0.128 0.557,0.623 -0.305,1.118 ; -0.305,0.128 1.17,0.128 ; -0.305,0.128 -0.305,1.118 ; 1.17,-0.128 1.93,-0.128 ; 1.17,-0.128 1.17,-0.533 1.93,-0.533 ; 1.17,0.128 1.17,0.533 1.93,0.533 ; 1.17,0.128 1.93,0.128 ; 1.93,-1.192 1.55,-0.99 1.93,-0.787 ; 1.93,-1.192 1.17,-1.192 1.17,-0.787 1.93,-0.787 ; 1.93,-1.192 1.93,-0.787 ; 1.93,-0.533 1.55,-0.33 1.93,-0.128 ; 1.93,-0.533 1.93,-0.128 ; 1.93,0.128 1.55,0.33 1.93,0.533 ; 1.93,0.128 1.93,0.533 ; 1.93,0.787 1.55,0.99 1.93,1.192 ; 1.93,0.787 1.17,0.787 1.17,1.192 1.93,1.192 ; 1.93,0.787 1.93,1.192
Mechanical 14:
  lines w0.1: -1.605,-1.18 -1.805,-1.18 -1.805,-0.77 -1.605,-0.77 ; -1.605,-0.53 -1.805,-0.53 -1.805,-0.12 -1.605,-0.12 ; -1.605,0.12 -1.805,0.12 -1.805,0.53 -1.605,0.53 ; -1.605,0.605 -0.605,1.605 ; -1.605,0.705 -0.705,1.605 ; -1.605,0.77 -1.805,0.77 -1.805,1.18 -1.605,1.18 ; -1.605,0.805 -0.805,1.605 ; -1.605,0.905 -0.905,1.605 ; -1.605,1.005 -1.005,1.605 ; -1.605,1.105 -1.105,1.605 ; -1.605,1.205 -1.205,1.605 ; -1.605,1.305 -1.305,1.605 ; -1.605,1.405 -1.405,1.605 ; -1.605,1.505 -1.505,1.605 ; -0.35,-1.605 -0.35,-1.805 0.01,-1.805 0.01,-1.605 ; -0.35,1.605 -0.35,1.805 0.01,1.805 0.01,1.605 ; 1.605,-1.18 1.805,-1.18 1.805,-0.77 1.605,-0.77 ; 1.605,-0.53 1.805,-0.53 1.805,-0.12 1.605,-0.12 ; 1.605,0.12 1.805,0.12 1.805,0.53 1.605,0.53 ; 1.605,0.77 1.805,0.77 1.805,1.18 1.605,1.18 ; -1.605,-1.605 1.605,-1.605 1.605,1.605 -1.605,1.605 -1.605,-1.605
Mechanical 15:
  lines w0.05: -2.18,-2.055 2.18,-2.055 2.18,2.055 -2.18,2.055 -2.18,-2.055
3D body "VISHAY_POWERPAK-1212-8-DUAL.stp": height 1.12, standoff 0, extent -1.805,-1.805 1.805,1.805